# Altium footprint library ESP32-PicoDK.PcbLib: 68 footprints (part 5 of 5)
Each footprint in its own frame and in the unit in brackets; x right, y up, seen from the top. Pads: shape width x height; smd on the part's side, far side on the other; paste and mask are expansions set on the pad; w line width, h text height; cw(c..) or ccw(c..) is an arc to the next point about the centre after c.
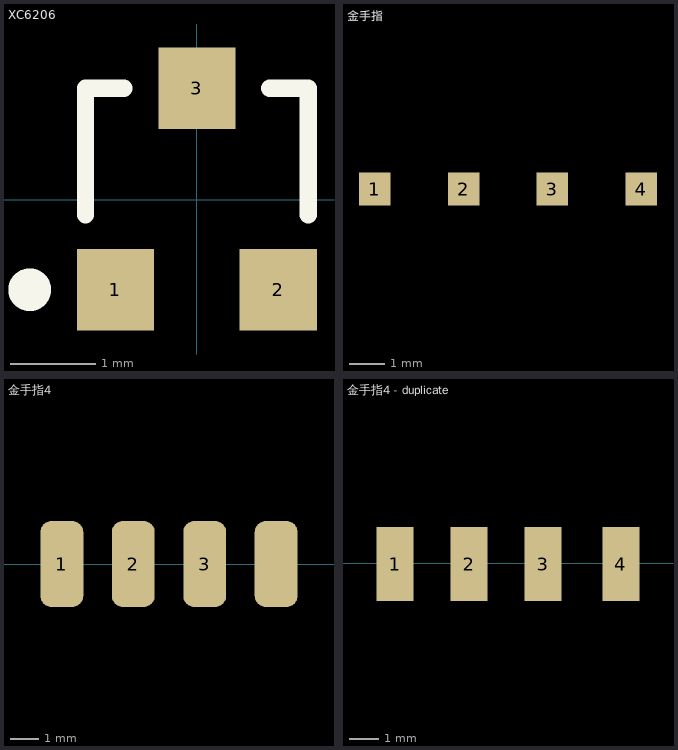
[diagram p4: the footprints below, top view; thin cyan lines are the x and y axes]

## XC6206 [mm]
pads (3):
  rect 0.9x0.95 smd: 1(-0.95,-1.048) 2(0.95,-1.048) 3(0,1.302)
Top Overlay:
  circle w0.25: c-1.95,-1.048 r0.125
  lines w0.2: -1.3,-0.173 -1.3,1.302 -0.85,1.302 ; 0.85,1.302 1.3,1.302 1.3,-0.173
3D body "SW3dPS-3-lead sot23-3.STEP": height 1.11, standoff 0.09, extent -1.436,-1.161 1.484,1.315

## 金手指 [mm]
pads (4):
  rect 0.9x0.95 smd: 1(-102.169,-68.358) 2(-99.629,-68.358) 3(-97.089,-68.358) 4(-94.549,-68.358)
3D body "HDR2.54-1P.STEP": height 2.54, standoff -8.96, extent -95.885,-69.596 -93.345,-67.056
3D body "HDR2.54-1P.STEP": height 2.54, standoff -8.96, extent -98.425,-69.596 -95.885,-67.056
3D body "HDR2.54-1P.STEP": height 2.54, standoff -8.96, extent -100.965,-69.596 -98.425,-67.056
3D body "HDR2.54-1P.STEP": height 2.54, standoff -8.96, extent -103.505,-69.596 -100.965,-67.056

## 金手指4 [mil] "金手指，4脚"
height 59.06
pads (4):
  rrect50% 60x120 smd: 1(-850,0) 2(-750,0) 3(-650,0) ""(-550,0)
3D body "HDR2.54-1P.STEP": height 100.11, standoff -352.65, extent -900,-45 -800,55
3D body "HDR2.54-1P.STEP": height 100.11, standoff -352.65, extent -800,-49.99 -700,50.01
3D body "HDR2.54-1P.STEP": height 100.11, standoff -352.65, extent -600,-49.99 -500,50.01
3D body "HDR2.54-1P.STEP": height 100.11, standoff -352.65, extent -700,-49.99 -600,50.01
3D body "HDR2.54-1P.STEP": height 100.11, standoff -352.65, extent -900,-50 -800,50

## 金手指4 - duplicate [mm] "金手指，4脚"
height 1.5
pads (4):
  rect 1.27x2.54 smd: 1(-21.651,-0.032) 2(-19.111,-0.032) 3(-16.571,-0.032) 4(-13.904,-0.032)
3D body "HDR2.54-1P.STEP": height 2.54, standoff -8.96, extent -22.86,-1.27 -20.32,1.27
3D body "HDR2.54-1P.STEP": height 2.54, standoff -8.96, extent -17.78,-1.27 -15.24,1.27
3D body "HDR2.54-1P.STEP": height 2.54, standoff -8.96, extent -15.24,-1.27 -12.7,1.27
3D body "HDR2.54-1P.STEP": height 2.54, standoff -8.96, extent -20.32,-1.27 -17.78,1.27